# Altium footprint library ICs And Semiconductors SMD.PcbLib: 943 footprints (part 22 of 60)
Each footprint in its own frame and in the unit in brackets; x right, y up, seen from the top. Pads: shape width x height; smd on the part's side, far side on the other; paste and mask are expansions set on the pad; w line width, h text height; cw(c..) or ccw(c..) is an arc to the next point about the centre after c.
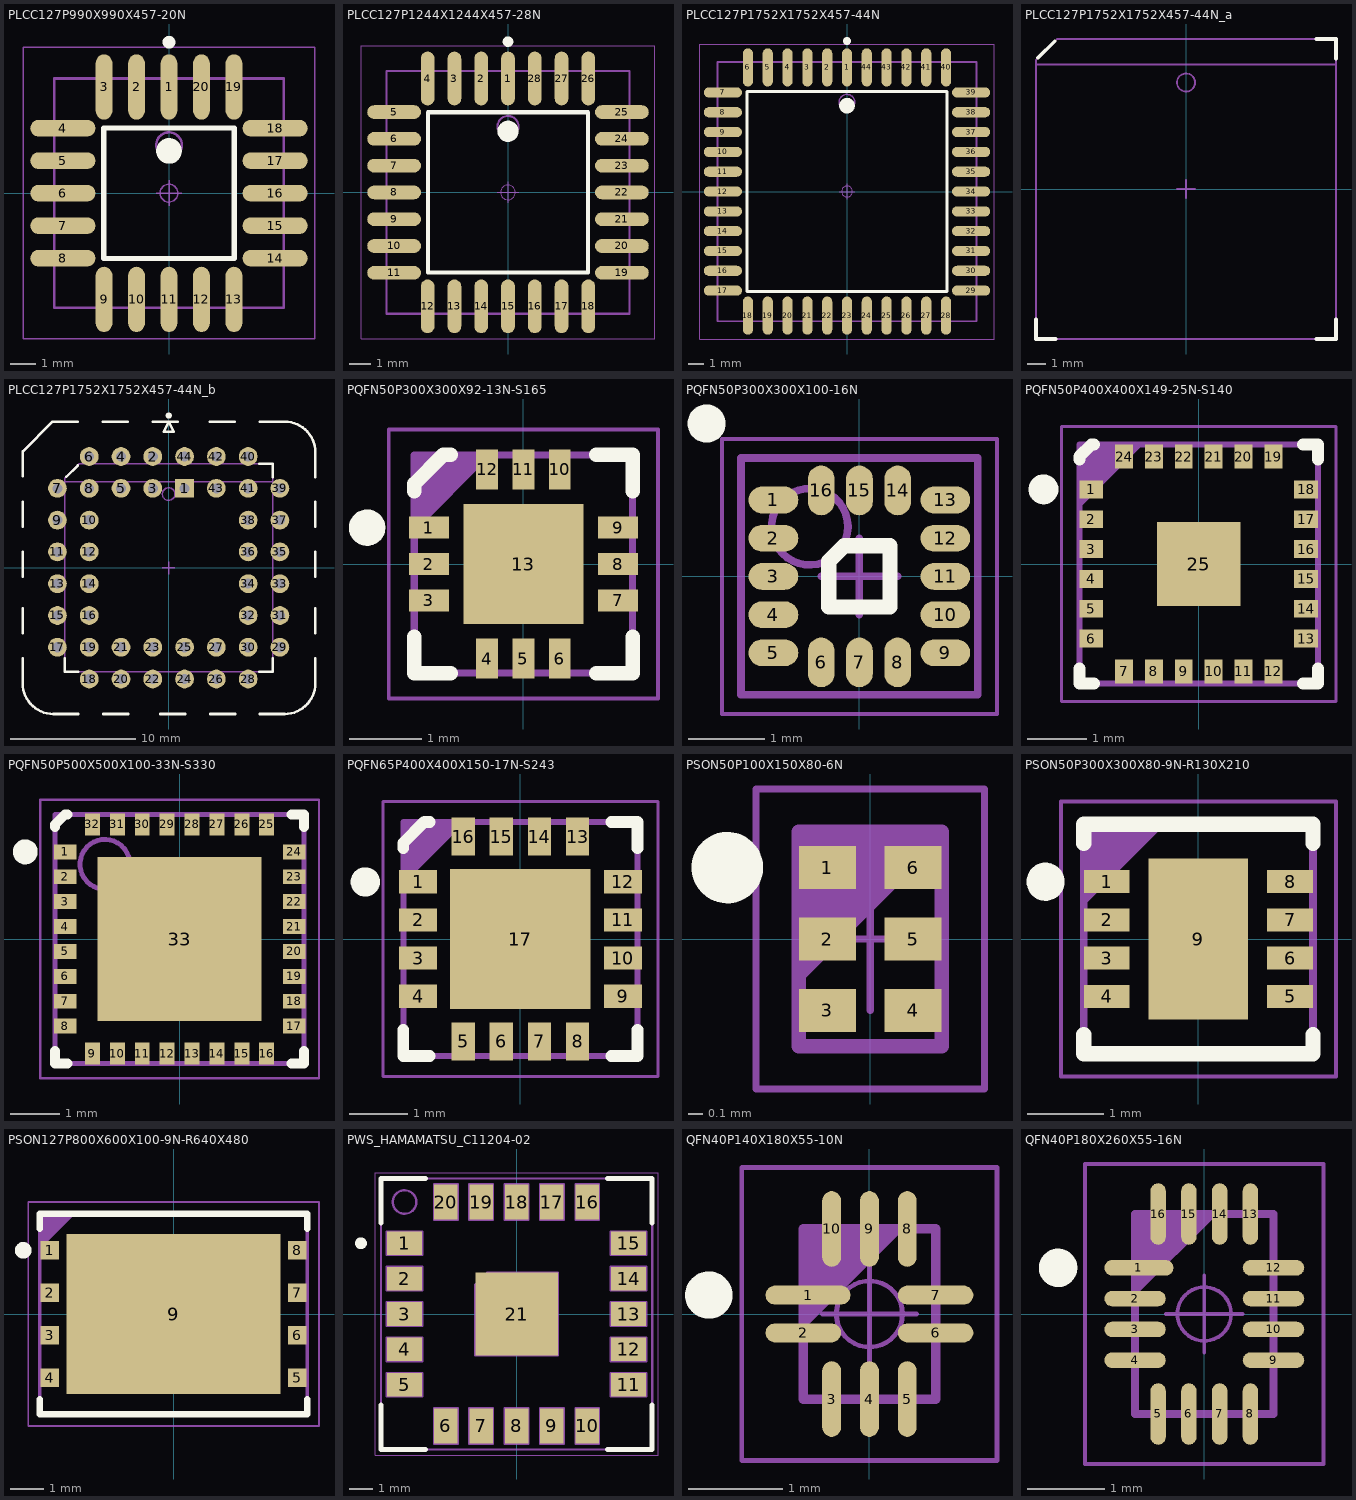
[diagram p21: the footprints below, top view; thin cyan lines are the x and y axes]

## PLCC127P990X990X457-20N [mm] "PLCC, 1.27mm Pitch, Square; 20 Pin, 8.97mm L X 8.97mm W X 4.57mm H Body, IPC Medium Density"
height 4.57
pads (20):
  oval 0.65x2.55 smd: 1(0,4.15) 2(-1.27,4.15) 3(-2.54,4.15) 9(-2.54,-4.15) 10(-1.27,-4.15) 11(0,-4.15) 12(1.27,-4.15) 13(2.54,-4.15) 19(2.54,4.15) 20(1.27,4.15)
  oval 2.55x0.65 smd: 4(-4.15,2.54) 5(-4.15,1.27) 6(-4.15,0) 7(-4.15,-1.27) 8(-4.15,-2.54) 14(4.15,-2.54) 15(4.15,-1.27) 16(4.15,0) 17(4.15,1.27) 18(4.15,2.54)
Top Overlay:
  circle w0.25: c0,5.9 r0.125
  circle w0.5: c0,1.65 r0.25
  lines w0.2: -2.55,-2.55 2.55,-2.55 2.55,2.55 -2.55,2.55 -2.55,-2.55
Mechanical 14:
  circle w0.1: c0,1.875 r0.5
  lines w0.1: -4.482,-4.482 4.482,-4.482 4.482,4.482 -4.482,4.482 -4.482,-4.482
Mechanical 15:
  circle w0.05: c0,0 r0.35
  lines w0.05: -0.5,0 0.5,0 ; 0,-0.5 0,0.5 ; -5.7,-5.7 5.7,-5.7 5.7,5.7 -5.7,5.7 -5.7,-5.7
3D body "PLCC127P990X990X457-20N.stp": height 4.57, standoff 0, extent -4.95,-4.944 4.95,4.944

## PLCC127P1244X1244X457-28N [mm] "PLCC, 1.27mm Pitch, Square; 7 Pin X 7 Pin, 11.50mm L X 11.50mm W X 4.57mm H body, IPC Medium Density"
height 4.57
pads (28):
  oval 0.65x2.55 smd: 1(0,5.4) 2(-1.27,5.4) 3(-2.54,5.4) 4(-3.81,5.4) 12(-3.81,-5.4) 13(-2.54,-5.4) 14(-1.27,-5.4) 15(0,-5.4) 16(1.27,-5.4) 17(2.54,-5.4) 18(3.81,-5.4) 26(3.81,5.4) 27(2.54,5.4) 28(1.27,5.4)
  oval 2.55x0.65 smd: 5(-5.4,3.81) 6(-5.4,2.54) 7(-5.4,1.27) 8(-5.4,0) 9(-5.4,-1.27) 10(-5.4,-2.54) 11(-5.4,-3.81) 19(5.4,-3.81) 20(5.4,-2.54) 21(5.4,-1.27) 22(5.4,0) 23(5.4,1.27) 24(5.4,2.54) 25(5.4,3.81)
Top Overlay:
  circle w0.25: c0,7.15 r0.125
  circle w0.5: c0,2.9 r0.25
  lines w0.2: -3.8,-3.8 3.8,-3.8 3.8,3.8 -3.8,3.8 -3.8,-3.8
Mechanical 14:
  circle w0.1: c0,3.125 r0.5
  lines w0.1: -5.752,-5.752 5.752,-5.752 5.752,5.752 -5.752,5.752 -5.752,-5.752
Mechanical 15:
  circle w0.05: c0,0 r0.35
  lines w0.05: -0.5,0 0.5,0 ; 0,-0.5 0,0.5 ; -6.95,-6.95 6.95,-6.95 6.95,6.95 -6.95,6.95 -6.95,-6.95
3D body "PLCC127P1244X1244X457-28N.stp": height 4.5, standoff 0, extent -6.159,-6.157 6.16,6.162

## PLCC127P1752X1752X457-44N [mm] "PLCC, 1.27mm Pitch, Square; 44 Pin, 16.60mm L X 16.60mm W X 4.57mm H Body, IPC Medium Density"
height 4.57
pads (44):
  oval 0.65x2.45 smd: 1(0,7.95) 2(-1.27,7.95) 3(-2.54,7.95) 4(-3.81,7.95) 5(-5.08,7.95) 6(-6.35,7.95) 18(-6.35,-7.95) 19(-5.08,-7.95) 20(-3.81,-7.95) 21(-2.54,-7.95) 22(-1.27,-7.95) 23(0,-7.95) 24(1.27,-7.95) 25(2.54,-7.95) 26(3.81,-7.95) 27(5.08,-7.95) 28(6.35,-7.95) 40(6.35,7.95) 41(5.08,7.95) 42(3.81,7.95) 43(2.54,7.95) 44(1.27,7.95)
  oval 2.45x0.65 smd: 7(-7.95,6.35) 8(-7.95,5.08) 9(-7.95,3.81) 10(-7.95,2.54) 11(-7.95,1.27) 12(-7.95,0) 13(-7.95,-1.27) 14(-7.95,-2.54) 15(-7.95,-3.81) 16(-7.95,-5.08) 17(-7.95,-6.35) 29(7.95,-6.35) 30(7.95,-5.08) 31(7.95,-3.81) 32(7.95,-2.54) 33(7.95,-1.27) 34(7.95,0) 35(7.95,1.27) 36(7.95,2.54) 37(7.95,3.81) 38(7.95,5.08) 39(7.95,6.35)
Top Overlay:
  circle w0.25: c0,9.65 r0.125
  circle w0.5: c0,5.5 r0.25
  lines w0.2: -6.4,-6.4 6.4,-6.4 6.4,6.4 -6.4,6.4 -6.4,-6.4
Mechanical 14:
  circle w0.1: c0,5.725 r0.5
  lines w0.1: -8.3,-8.3 8.3,-8.3 8.3,8.3 -8.3,8.3 -8.3,-8.3
Mechanical 15:
  circle w0.05: c0,0 r0.35
  lines w0.05: -0.5,0 0.5,0 ; 0,-0.5 0,0.5 ; -9.45,-9.45 9.45,-9.45 9.45,9.45 -9.45,9.45 -9.45,-9.45
3D body "PLCC127P1752X1752X457-44N.stp": height 4.39, standoff 0, extent -8.762,-8.762 8.763,8.763

## PLCC127P1752X1752X457-44N_a [mm] "PLCC, 1.27mm Pitch, Square; 44 Pin, 16.60mm L X 16.60mm W X 4.57mm H Body, IPC Medium Density"
height 4.57
Top Overlay:
  lines w0.2: -8.3,-7.219 -8.3,-8.3 -7.219,-8.3 ; -8.188,7.261 -7.256,8.182 ; 7.219,-8.3 8.3,-8.3 8.3,-7.219 ; 7.219,8.3 8.3,8.3 8.3,7.219
Mechanical 8:
  lines w0.1: -0.5,0 0,0 ; 0,-0.5 0,0 ; 0,0.5 0,0 ; 0.5,0 0,0
Mechanical 14:
  circle w0.1: c0,5.893 r0.5
  lines w0.1: -8.3,6.893 8.3,6.893 ; -8.3,7.149 -8.3,-8.3 8.3,-8.3 8.3,8.3 -7.136,8.3 -8.301,7.15
3D body "PLCC127P1752X1752X457-44N.stp": height 4.39, standoff 0, extent -8.762,-8.762 8.763,8.763

## PLCC127P1752X1752X457-44N_b [mm] "44 Leads Through Hole PLCC Socket, Pitch 1.27 mm, Body 23.5x23.5mm"
height 8
pads (44):
  rect 1.5x1.5 hole 0.8: 1(1.27,6.35)
  round 1.5 hole 0.8: 2(-1.27,8.89) 3(-1.27,6.35) 4(-3.81,8.89) 5(-3.81,6.35) 6(-6.35,8.89) 7(-8.89,6.35) 8(-6.35,6.35) 9(-8.89,3.81) 10(-6.35,3.81) 11(-8.89,1.27) 12(-6.35,1.27) 13(-8.89,-1.27) 14(-6.35,-1.27) 15(-8.89,-3.81) 16(-6.35,-3.81) 17(-8.89,-6.35) 18(-6.35,-8.89) 19(-6.35,-6.35) 20(-3.81,-8.89) 21(-3.81,-6.35) 22(-1.27,-8.89) 23(-1.27,-6.35) 24(1.27,-8.89) 25(1.27,-6.35) 26(3.81,-8.89) 27(3.81,-6.35) 28(6.35,-8.89) 29(8.89,-6.35) 30(6.35,-6.35) 31(8.89,-3.81) 32(6.35,-3.81) 33(8.89,-1.27) 34(6.35,-1.27) 35(8.89,1.27) 36(6.35,1.27) 37(8.89,3.81) 38(6.35,3.81) 39(8.89,6.35) 40(6.35,8.89) 41(6.35,6.35) 42(3.81,8.89) 43(3.81,6.35) 44(1.27,8.89)
Top Overlay:
  circle w0.25: c0.005,12.165 r0.125
  lines w0.2: -11.659,-7.246 -11.659,-9.246 ccw(c-9.22,-9.246) -9.22,-11.685 -7.22,-11.685 ; -11.659,-5.246 -11.659,-3.246 ; -11.659,-0.703 -11.659,1.297 ; -11.659,3.297 -11.659,5.297 ; -11.659,7.297 -11.659,9.297 -9.271,11.685 -7.271,11.685 ; -8.3,-7.219 -8.3,-8.3 -7.219,-8.3 ; -8.189,7.261 -7.256,8.182 ; -5.272,11.685 -3.272,11.685 ; -5.22,-11.685 -3.22,-11.685 ; -1.272,11.685 0.728,11.685 ; -0.677,-11.685 1.323,-11.685 ; 3.271,11.685 5.271,11.685 ; 3.323,-11.685 5.323,-11.685 ; 7.218,-8.3 8.3,-8.3 8.3,-7.219 ; 7.218,8.3 8.3,8.3 8.3,7.219 ; 7.271,-11.685 9.271,-11.685 ccw(c9.271,-9.246) 11.709,-9.246 11.709,-7.246 ; 7.271,11.685 9.271,11.685 cw(c9.271,9.246) 11.709,9.246 11.709,7.246 ; 11.709,-5.246 11.709,-3.246 ; 11.709,-0.703 11.709,1.297 ; 11.709,3.297 11.709,5.297 ; -0.4,10.885 0.4,10.885 0,11.685 -0.4,10.885
Mechanical 8:
  drawing of 360 lines, arcs and shapes, not listed
Mechanical 14:
  circle w0.1: c0,5.893 r0.5
  circle w0.1: c0.005,12.165 r0.125
  lines w0.1: -11.659,-7.246 -11.659,-9.246 ccw(c-9.22,-9.246) -9.22,-11.685 -7.22,-11.685 ; -11.659,-5.246 -11.659,-3.246 ; -11.659,-0.703 -11.659,1.297 ; -11.659,3.297 -11.659,5.297 ; -11.659,7.297 -11.659,9.297 -9.271,11.685 -7.271,11.685 ; -8.3,-7.219 -8.3,-8.3 ; -8.301,6.893 8.3,6.893 ; -8.301,7.149 -8.3,-8.3 ; -8.301,7.15 -7.136,8.3 8.3,8.3 ; -8.189,7.261 -7.256,8.182 ; -7.219,-8.3 -8.3,-8.3 ; -5.272,11.685 -3.272,11.685 ; -5.22,-11.685 -3.22,-11.685 ; -1.272,11.685 0.728,11.685 ; -0.677,-11.685 1.323,-11.685 ; 3.271,11.685 5.271,11.685 ; 3.323,-11.685 5.323,-11.685 ; 7.218,-8.3 8.3,-8.3 ; 7.218,8.3 8.3,8.3 ; 7.271,-11.685 9.271,-11.685 ccw(c9.271,-9.246) 11.709,-9.246 11.709,-7.246 ; 7.271,11.685 9.271,11.685 cw(c9.271,9.246) 11.709,9.246 11.709,7.246 ; 8.3,-7.219 8.3,-8.3 ; 8.3,7.219 8.3,8.3 ; 11.709,-5.246 11.709,-3.246 ; 11.709,-0.703 11.709,1.297 ; 11.709,3.297 11.709,5.297 ; -8.3,-8.3 8.3,-8.3 ; 8.3,-8.3 8.3,8.3 ; -0.4,10.885 0,11.685 0.4,10.885 -0.4,10.885
3D body "PLCC127P1752X1752X457-44N.stp": height 8.25, standoff 3.87, extent -8.762,-8.762 8.763,8.763

## PQFN50P300X300X92-13N-S165 [mm] "QFN, 0.50mm pitch,square; 12 Pin, 3mm X 3mm X 0.92mm H body (With Pullback Leads,Thermal Tab 1.65 X 1.65mm),  IPC Medium Density"
height 0.92
pads (13):
  rect 0.55x0.3 smd: 1(-1.3,0.5) 2(-1.3,0) 3(-1.3,-0.5) 7(1.3,-0.5) 8(1.3,0) 9(1.3,0.5)
  rect 0.3x0.55 smd: 4(-0.5,-1.3) 5(0,-1.3) 6(0.5,-1.3) 10(0.5,1.3) 11(0,1.3) 12(-0.5,1.3)
  rect 1.65x1.65 smd: 13(0,0)
Top Overlay:
  circle w0.25: c-2.15,0.5 r0.125
  lines w0.2: -1.5,-1 -1.5,-1.5 -1,-1.5 ; -1.5,1 -1.5,1.1 -1.1,1.5 -1,1.5 ; 1,-1.5 1.5,-1.5 1.5,-1 ; 1,1.5 1.5,1.5 1.5,1
Mechanical 14:
  lines w0.1: -1.5,0.5 -0.5,1.5 ; -1.5,0.6 -0.6,1.5 ; -1.5,0.7 -0.7,1.5 ; -1.5,0.8 -0.8,1.5 ; -1.5,0.9 -0.9,1.5 ; -1.5,1 -1,1.5 ; -1.5,1.1 -1.1,1.5 ; -1.5,1.2 -1.2,1.5 ; -1.5,1.3 -1.3,1.5 ; -1.5,1.4 -1.4,1.5 ; -1.5,-1.5 -1.5,1.5 1.5,1.5 1.5,-1.5 -1.5,-1.5
Mechanical 15:
  circle w0.05: c0,0 r0.35
  lines w0.05: -0.5,0 0.5,0 ; 0,-0.5 0,0.5 ; -1.85,-1.85 -1.85,1.85 1.85,1.85 1.85,-1.85 -1.85,-1.85
3D body "PQFN50P300X300X92-13N-S165.stp": height 0.92, standoff 0, extent -1.565,-1.565 1.565,1.565

## PQFN50P300X300X100-16N [mm] "PQFN, 16-Leads, Body 3x3mm, Pitch 0.50mm, IPC Medium Density"
height 1
pads (16):
  oval 0.65x0.35 smd: 1(-1.125,1) 2(-1.125,0.5) 3(-1.125,0) 4(-1.125,-0.5) 5(-1.125,-1) 9(1.125,-1) 10(1.125,-0.5) 11(1.125,0) 12(1.125,0.5) 13(1.125,1)
  oval 0.35x0.65 smd: 6(-0.5,-1.125) 7(0,-1.125) 8(0.5,-1.125) 14(0.5,1.125) 15(0,1.125) 16(-0.5,1.125)
Top Overlay:
  circle w0.25: c-2,2 r0.125
  lines w0.2: -0.4,-0.4 -0.4,0.2 -0.2,0.4 0.4,0.4 0.4,-0.4 -0.4,-0.4
Mechanical 14:
  circle w0.1: c-0.65,0.65 r0.5
  lines w0.1: -1.55,-1.55 -1.55,1.55 1.55,1.55 1.55,-1.55 -1.55,-1.55
Mechanical 15:
  lines w0.05: -1.8,-1.8 -1.8,1.8 1.8,1.8 1.8,-1.8 -1.8,-1.8
  lines w0.1: -0.5,0 0.5,0 ; 0,-0.5 0,0.5
3D body "PQFN50P300X300X100-16N.stp": height 1.01, standoff 0.01, extent -1.565,-1.565 1.565,1.565

## PQFN50P400X400X149-25N-S140 [mm] "QFN, 0.50mm pitch, Square; 24 Pin, 4.00mm L X 4.00mm W X 1.49mm H body (w/Pullback Leads, Thermal Tab 1.4 X 1.4mm),  IPC Medium Density"
height 1.49
pads (25):
  rect 0.4x0.3 smd: 1(-1.8,1.25) 2(-1.8,0.75) 3(-1.8,0.25) 4(-1.8,-0.25) 5(-1.8,-0.75) 6(-1.8,-1.25) 13(1.8,-1.25) 14(1.8,-0.75) 15(1.8,-0.25) 16(1.8,0.25) 17(1.8,0.75) 18(1.8,1.25)
  rect 0.3x0.4 smd: 7(-1.25,-1.8) 8(-0.75,-1.8) 9(-0.25,-1.8) 10(0.25,-1.8) 11(0.75,-1.8) 12(1.25,-1.8) 19(1.25,1.8) 20(0.75,1.8) 21(0.25,1.8) 22(-0.25,1.8) 23(-0.75,1.8) 24(-1.25,1.8)
  rect 1.4x1.4 smd: 25(0,0)
Top Overlay:
  circle w0.25: c-2.6,1.25 r0.125
  lines w0.2: -2,-1.75 -2,-2 -1.75,-2 ; -2,1.75 -2,1.8 -1.8,2 -1.75,2 ; 1.75,-2 2,-2 2,-1.75 ; 1.75,2 2,2 2,1.75
Mechanical 14:
  lines w0.1: -2,1 -1,2 ; -2,1.1 -1.1,2 ; -2,1.2 -1.2,2 ; -2,1.3 -1.3,2 ; -2,1.4 -1.4,2 ; -2,1.5 -1.5,2 ; -2,1.6 -1.6,2 ; -2,1.7 -1.7,2 ; -2,1.8 -1.8,2 ; -2,1.9 -1.9,2 ; -2,-2 2,-2 2,2 -2,2 -2,-2
Mechanical 15:
  circle w0.05: c0,0 r0.35
  lines w0.05: -0.5,0 0.5,0 ; 0,-0.5 0,0.5 ; -2.3,-2.3 2.3,-2.3 2.3,2.3 -2.3,2.3 -2.3,-2.3
3D body "PQFN50P400X400X149-25N-S140.stp": height 1.49, standoff 0, extent -2,-2 2,2

## PQFN50P500X500X100-33N-S330 [mm] "QFN, 0.50mm pitch, Square; 32 Pin, 5.00mm L X 5.00mm W X 1.00mm H body (w/Pullback Leads, Thermal Tab 3.3 X 3.3mm),  IPC Medium Density"
height 1
pads (33):
  rect 0.45x0.3 smd: 1(-2.3,1.75) 2(-2.3,1.25) 3(-2.3,0.75) 4(-2.3,0.25) 5(-2.3,-0.25) 6(-2.3,-0.75) 7(-2.3,-1.25) 8(-2.3,-1.75) 17(2.3,-1.75) 18(2.3,-1.25) 19(2.3,-0.75) 20(2.3,-0.25) 21(2.3,0.25) 22(2.3,0.75) 23(2.3,1.25) 24(2.3,1.75)
  rect 0.3x0.45 smd: 9(-1.75,-2.3) 10(-1.25,-2.3) 11(-0.75,-2.3) 12(-0.25,-2.3) 13(0.25,-2.3) 14(0.75,-2.3) 15(1.25,-2.3) 16(1.75,-2.3) 25(1.75,2.3) 26(1.25,2.3) 27(0.75,2.3) 28(0.25,2.3) 29(-0.25,2.3) 30(-0.75,2.3) 31(-1.25,2.3) 32(-1.75,2.3)
  rect 3.3x3.3 smd: 33(0,0)
Top Overlay:
  circle w0.25: c-3.1,1.75 r0.125
  lines w0.2: -2.5,-2.25 -2.5,-2.5 -2.25,-2.5 ; -2.5,2.25 -2.5,2.3 -2.3,2.5 -2.25,2.5 ; 2.25,-2.5 2.5,-2.5 2.5,-2.25 ; 2.25,2.5 2.5,2.5 2.5,2.25
Mechanical 14:
  circle w0.1: c-1.5,1.5 r0.5
  lines w0.1: -2.5,-2.5 2.5,-2.5 2.5,2.5 -2.5,2.5 -2.5,-2.5
Mechanical 15:
  circle w0.05: c0,0 r0.35
  lines w0.05: -0.5,0 0.5,0 ; 0,-0.5 0,0.5 ; -2.8,-2.8 2.8,-2.8 2.8,2.8 -2.8,2.8 -2.8,-2.8
3D body "PQFN50P500X500X100-33N-S330.stp": height 1, standoff 0, extent -2.5,-2.5 2.5,2.5

## PQFN65P400X400X150-17N-S243 [mm] "QFN, 0.65mm Pitch, Square; 16 Pin, 4.00mm L X 4.00mm W X 1.50mm H Body (With Pullback Leads,Thermal Tab 2.43 X 2.43mm),  IPC Medium Density"
height 1.5
pads (17):
  rect 0.65x0.4 smd: 1(-1.75,0.975) 2(-1.75,0.325) 3(-1.75,-0.325) 4(-1.75,-0.975) 9(1.75,-0.975) 10(1.75,-0.325) 11(1.75,0.325) 12(1.75,0.975)
  rect 0.4x0.65 smd: 5(-0.975,-1.75) 6(-0.325,-1.75) 7(0.325,-1.75) 8(0.975,-1.75) 13(0.975,1.75) 14(0.325,1.75) 15(-0.325,1.75) 16(-0.975,1.75)
  rect 2.4x2.4 smd: 17(0,0)
Top Overlay:
  circle w0.25: c-2.65,0.975 r0.125
  lines w0.2: -2,-1.55 -2,-2 -1.55,-2 ; -2,1.55 -2,1.64 -1.64,2 -1.55,2 ; 1.55,-2 2,-2 2,-1.55 ; 1.55,2 2,2 2,1.55
Mechanical 14:
  lines w0.1: -2,1 -1,2 ; -2,1.1 -1.1,2 ; -2,1.2 -1.2,2 ; -2,1.3 -1.3,2 ; -2,1.4 -1.4,2 ; -2,1.5 -1.5,2 ; -2,1.6 -1.6,2 ; -2,1.7 -1.7,2 ; -2,1.8 -1.8,2 ; -2,1.9 -1.9,2 ; -2,-2 -2,2 2,2 2,-2 -2,-2
Mechanical 15:
  circle w0.05: c0,0 r0.35
  lines w0.05: -0.5,0 0.5,0 ; 0,-0.5 0,0.5 ; -2.35,-2.35 -2.35,2.35 2.35,2.35 2.35,-2.35 -2.35,-2.35
3D body "PQFN65P400X400X150-17N-S243.stp": height 1.45, standoff -0.05, extent -2,-2 2,2

## PSON50P100X150X80-6N [mm] "SON, 0.50mm,pitch; 6 pin,1.00mm W X 1.50mm L X 0.80mm H body (w/pullback leads),  IPC Medium Density"
height 0.8
pads (6):
  rect 0.4x0.3 smd: 1(-0.3,0.5) 2(-0.3,0) 3(-0.3,-0.5) 4(0.3,-0.5) 5(0.3,0) 6(0.3,0.5)
Top Overlay:
  circle w0.25: c-1,0.5 r0.125
Mechanical 14:
  lines w0.1: -0.5,-0.25 0.5,0.75 ; -0.5,-0.15 0.4,0.75 ; -0.5,-0.05 0.3,0.75 ; -0.5,0.05 0.2,0.75 ; -0.5,0.15 0.1,0.75 ; -0.5,0.25 0,0.75 ; -0.5,0.35 -0.1,0.75 ; -0.5,0.45 -0.2,0.75 ; -0.5,0.55 -0.3,0.75 ; -0.5,0.65 -0.4,0.75 ; 0.5,0.75 -0.5,0.75 -0.5,-0.75 0.5,-0.75 0.5,0.75
Mechanical 15:
  lines w0.05: -0.5,0 0.5,0 ; 0,-0.5 0,0.5 ; -0.8,-1.05 -0.8,1.05 0.8,1.05 0.8,-1.05 -0.8,-1.05
3D body "PSON50P100X150X80-6N.stp": height 0.8, standoff 0, extent -0.5,-0.75 0.5,0.75

## PSON50P300X300X80-9N-R130X210 [mm] "SON,  0.50mm pitch, 10 pin, 3mm X 3mm X 0.8mm H body (w/thermal tab 1.3 X 2.1mm),  IPC Medium Density"
height 0.8
pads (9):
  rect 0.6x0.3 smd: 1(-1.2,0.75) 2(-1.2,0.25) 3(-1.2,-0.25) 4(-1.2,-0.75) 5(1.2,-0.75) 6(1.2,-0.25) 7(1.2,0.25) 8(1.2,0.75)
  rect 1.3x2.1 smd: 9(0,0)
Top Overlay:
  circle w0.25: c-2,0.75 r0.125
  lines w0.2: -1.5,-1.25 -1.5,-1.5 1.5,-1.5 1.5,-1.25 ; -1.5,1.25 -1.5,1.5 1.5,1.5 1.5,1.25
Mechanical 14:
  lines w0.1: -1.5,0.5 -0.5,1.5 ; -1.5,0.6 -0.6,1.5 ; -1.5,0.7 -0.7,1.5 ; -1.5,0.8 -0.8,1.5 ; -1.5,0.9 -0.9,1.5 ; -1.5,1 -1,1.5 ; -1.5,1.1 -1.1,1.5 ; -1.5,1.2 -1.2,1.5 ; -1.5,1.3 -1.3,1.5 ; -1.5,1.4 -1.4,1.5 ; -1.5,-1.5 1.5,-1.5 1.5,1.5 -1.5,1.5 -1.5,-1.5
Mechanical 15:
  circle w0.05: c0,0 r0.35
  lines w0.05: -0.5,0 0.5,0 ; 0,-0.5 0,0.5 ; -1.8,-1.8 1.8,-1.8 1.8,1.8 -1.8,1.8 -1.8,-1.8
3D body "PSON50P300X300X80-9N-R130X210.stp": height 0.8, standoff 0, extent -1.5,-1.5 1.5,1.5

## PSON127P800X600X100-9N-R640X480 [mm] "SON,1.27mm,pitch; 8 pin,8.00mm W X 6.00mm L X 1.00mm H body (w/pullback leads,thermal tab 6.4 X 4.8mm), IPC Medium Density"
height 1
pads (9):
  rect 0.55x0.55 smd: 1(-3.7,1.905) 2(-3.7,0.635) 3(-3.7,-0.635) 4(-3.7,-1.905) 5(3.7,-1.905) 6(3.7,-0.635) 7(3.7,0.635) 8(3.7,1.905)
  rect 6.4x4.8 smd: 9(0,0)
Top Overlay:
  circle w0.25: c-4.5,1.905 r0.125
  lines w0.2: -4,-2.55 -4,-3 4,-3 4,-2.55 ; -4,2.55 -4,3 4,3 4,2.55
Top Paste:
  region: 0.33,0.33 2.53,0.33 2.53,1.73 0.33,1.73
  region: -2.53,0.33 -0.33,0.33 -0.33,1.73 -2.53,1.73
  region: 0.33,-1.73 2.53,-1.73 2.53,-0.33 0.33,-0.33
  region: -2.53,-1.73 -0.33,-1.73 -0.33,-0.33 -2.53,-0.33
Mechanical 14:
  lines w0.1: -4,2 -3,3 ; -4,2.1 -3.1,3 ; -4,2.2 -3.2,3 ; -4,2.3 -3.3,3 ; -4,2.4 -3.4,3 ; -4,2.5 -3.5,3 ; -4,2.6 -3.6,3 ; -4,2.7 -3.7,3 ; -4,2.8 -3.8,3 ; -4,2.9 -3.9,3 ; -4,-3 -4,3 4,3 4,-3 -4,-3
Mechanical 15:
  lines w0.05: -0.5,0 0.5,0 ; 0,-0.5 0,0.5 ; -4.35,-3.35 -4.35,3.35 4.35,3.35 4.35,-3.35 -4.35,-3.35
3D body "PSON127P800X600X100-9N-R640X480.stp": height 1, standoff 0, extent -4.1,-3.1 4.1,3.1

## PWS_HAMAMATSU_C11204-02 [mm] "QFN, 1.5mm pitch, Square; 20 Pin, 11.5mm X 11.5mm X 2mm H body (With Pullback Leads,Thermal Tab 3.5 X 3.5mm)"
height 2
pads (21):
  rect 1.5x1 smd: 1(-4.75,3) 2(-4.75,1.5) 3(-4.75,0) 4(-4.75,-1.5) 5(-4.75,-3) 11(4.75,-3) 12(4.75,-1.5) 13(4.75,0) 14(4.75,1.5) 15(4.75,3)
  rect 1x1.5 smd: 6(-3,-4.75) 7(-1.5,-4.75) 8(0,-4.75) 9(1.5,-4.75) 10(3,-4.75) 16(3,4.75) 17(1.5,4.75) 18(0,4.75) 19(-1.5,4.75) 20(-3,4.75)
  rect 3.5x3.5 smd: 21(0,0)
Top Overlay:
  circle w0.25: c-6.6,3 r0.125
  lines w0.2: -5.75,-3.85 -5.75,-5.75 -3.85,-5.75 ; -5.75,3.85 -5.75,5.75 -3.85,5.75 ; 3.85,-5.75 5.75,-5.75 5.75,-3.85 ; 3.85,5.75 5.75,5.75 5.75,3.85
Internal Plane 14:
  lines w0.1: -1.2,-1.2 1.2,-1.2 1.2,1.2 -1.2,1.2 -1.2,-1.2 ; -1,-1 1,-1 1,1 -1,1 -1,-1 ; -0.25,-1.2 0.25,-1.2 0.25,-1 -0.25,-1 -0.25,-1.2
Mechanical 8:
  drawing of 169 lines, arcs and shapes, not listed
Mechanical 14:
  circle w0.1: c-4.75,4.75 r0.5
  lines w0.1: -5.75,-5.75 5.75,-5.75 5.75,5.75 -5.75,5.75 -5.75,-5.75
Mechanical 15:
  lines w0.05: -6,-6 6,-6 6,6 -6,6 -6,-6
3D body "PWS_HAMAMATSU_C11204-02.stp": height 2, standoff 0, extent -5.75,-5.75 5.75,5.75

## QFN40P140X180X55-10N [mm] "QFN, 0.40mm Pitch, Rect.;10 Pin, 1.80mm L X 1.40mm W X 0.55mm H Body, IPC Medium Density"
height 0.55
pads (10):
  oval 0.9x0.2 smd: 1(-0.65,0.2)
  oval 0.8x0.2 smd: 2(-0.7,-0.2) 6(0.7,-0.2) 7(0.7,0.2)
  oval 0.2x0.8 smd: 3(-0.4,-0.9) 4(0,-0.9) 5(0.4,-0.9) 8(0.4,0.9) 9(0,0.9) 10(-0.4,0.9)
Top Overlay:
  circle w0.25: c-1.7,0.2 r0.125
Mechanical 14:
  lines w0.1: -0.7,-0.1 0.3,0.9 ; -0.7,0 0.2,0.9 ; -0.7,0.1 0.1,0.9 ; -0.7,0.2 0,0.9 ; -0.7,0.3 -0.1,0.9 ; -0.7,0.4 -0.2,0.9 ; -0.7,0.5 -0.3,0.9 ; -0.7,0.6 -0.4,0.9 ; -0.7,0.7 -0.5,0.9 ; -0.7,0.8 -0.6,0.9 ; -0.7,-0.9 0.7,-0.9 0.7,0.9 -0.7,0.9 -0.7,-0.9
Mechanical 15:
  circle w0.05: c0,0 r0.35
  lines w0.05: -0.5,0 0.5,0 ; 0,-0.5 0,0.5 ; -1.35,-1.55 1.35,-1.55 1.35,1.55 -1.35,1.55 -1.35,-1.55
3D body "QFN40P140X180X55-10N.stp": height 0.55, standoff 0, extent -0.7,-0.9 0.7,0.9

## QFN40P180X260X55-16N [mm] "QFN, 0.40mm Pitch, Rect.; 16 Pin, 2.60mm L X 1.80mm W X 0.55mm H Body, IPC Medium Density"
height 0.55
pads (16):
  oval 0.9x0.2 smd: 1(-0.85,0.6)
  oval 0.8x0.2 smd: 2(-0.9,0.2) 3(-0.9,-0.2) 4(-0.9,-0.6) 9(0.9,-0.6) 10(0.9,-0.2) 11(0.9,0.2) 12(0.9,0.6)
  oval 0.2x0.8 smd: 5(-0.6,-1.3) 6(-0.2,-1.3) 7(0.2,-1.3) 8(0.6,-1.3) 13(0.6,1.3) 14(0.2,1.3) 15(-0.2,1.3) 16(-0.6,1.3)
Top Overlay:
  circle w0.25: c-1.9,0.6 r0.125
Mechanical 14:
  lines w0.1: -0.9,0.3 0.1,1.3 ; -0.9,0.4 0,1.3 ; -0.9,0.5 -0.1,1.3 ; -0.9,0.6 -0.2,1.3 ; -0.9,0.7 -0.3,1.3 ; -0.9,0.8 -0.4,1.3 ; -0.9,0.9 -0.5,1.3 ; -0.9,1 -0.6,1.3 ; -0.9,1.1 -0.7,1.3 ; -0.9,1.2 -0.8,1.3 ; -0.9,-1.3 -0.9,1.3 0.9,1.3 0.9,-1.3 -0.9,-1.3
Mechanical 15:
  circle w0.05: c0,0 r0.35
  lines w0.05: -0.5,0 0.5,0 ; 0,-0.5 0,0.5 ; -1.55,-1.95 -1.55,1.95 1.55,1.95 1.55,-1.95 -1.55,-1.95
3D body "QFN40P180X260X55-16N.stp": height 0.55, standoff 0, extent -0.9,-1.3 0.9,1.3